# Altium footprint library Package_SO.PcbLib: 333 footprints (part 8 of 21)
Each footprint in its own frame and in the unit in brackets; x right, y up, seen from the top. Pads: shape width x height; smd on the part's side, far side on the other; paste and mask are expansions set on the pad; w line width, h text height; cw(c..) or ccw(c..) is an arc to the next point about the centre after c.
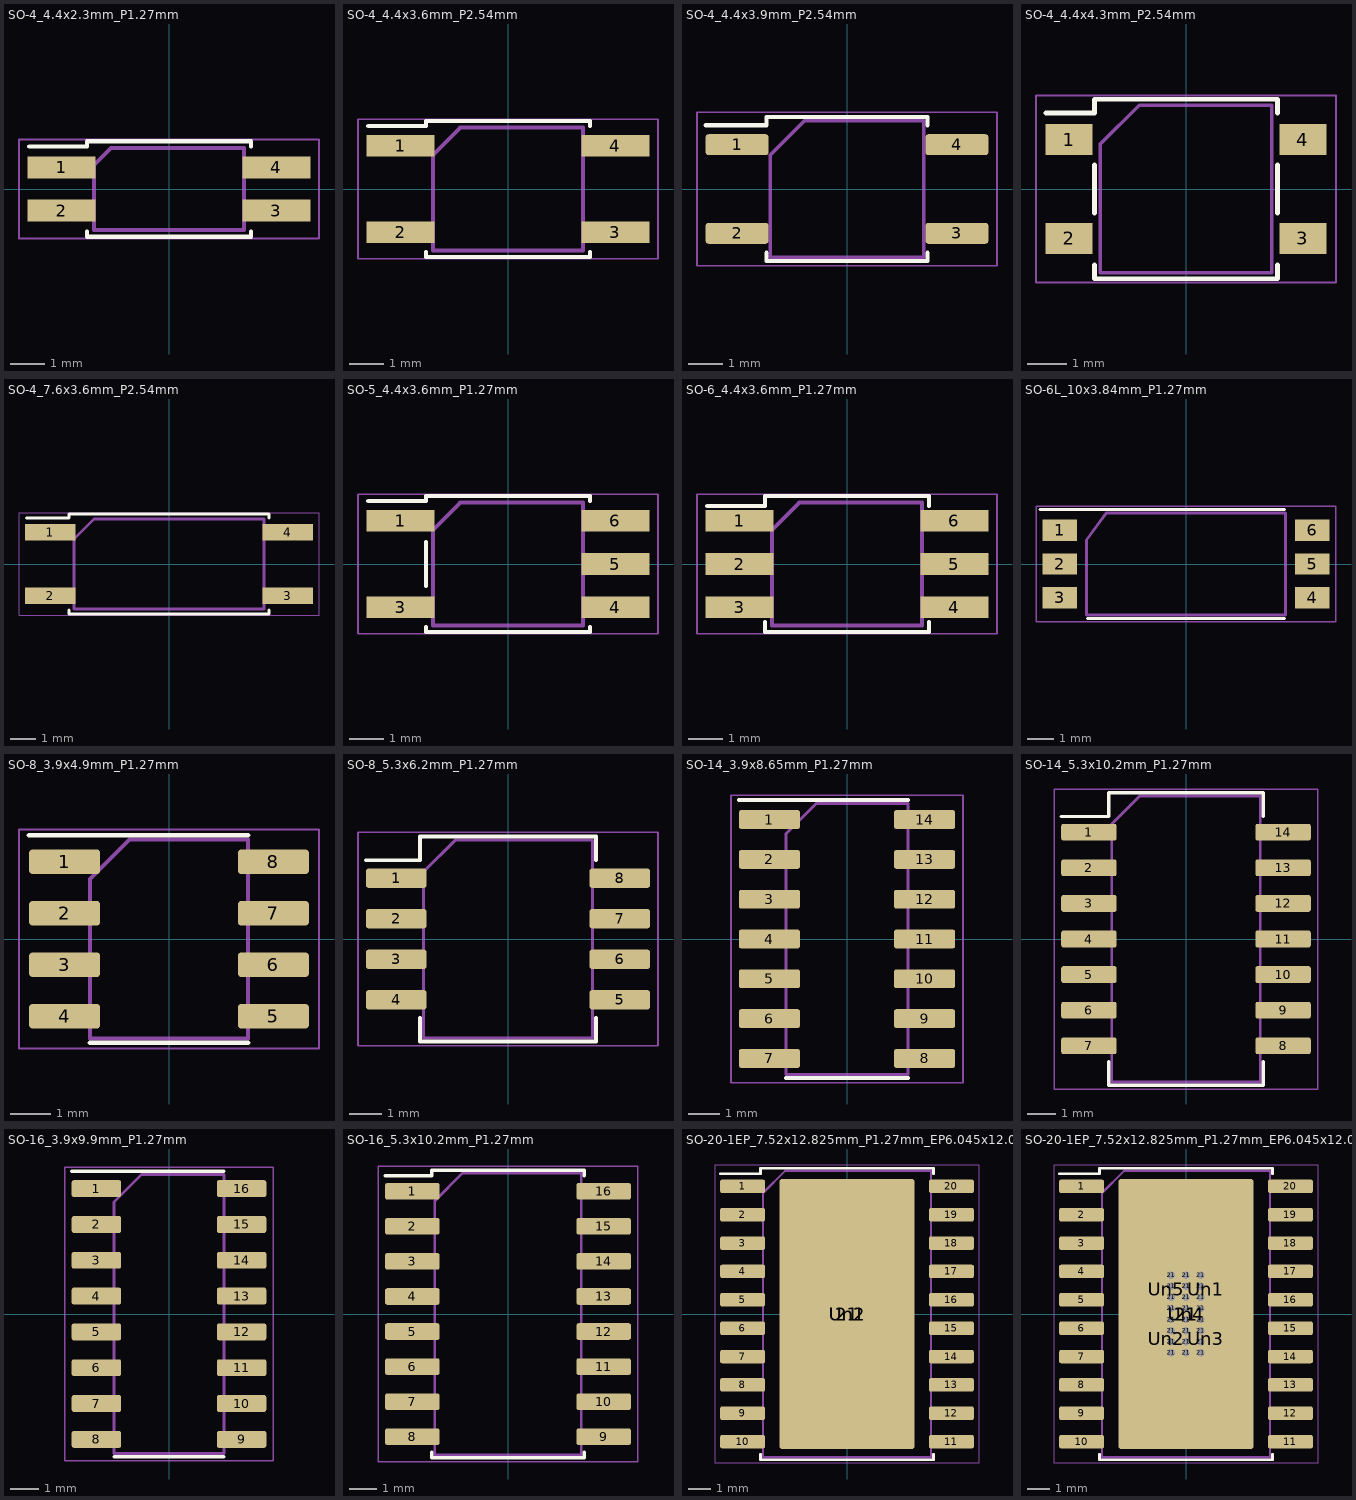
[diagram p7: the footprints below, top view; thin cyan lines are the x and y axes]

## SO-4_4.4x2.3mm_P1.27mm [mm]
pads (4):
  rect 2x0.64 smd: 1(-3.15,0.635) 2(-3.15,-0.635) 3(3.15,-0.635) 4(3.15,0.635)
F.SilkS:
  lines w0.12: -4.1,1.25 -2.4,1.25 -2.4,1.4 2.4,1.4 2.4,1.25 ; -2.4,-1.25 -2.4,-1.4 2.4,-1.4 2.4,-1.25
F.CrtYd:
  lines w0.05: -4.4,-1.45 -4.4,1.45 4.4,1.45 4.4,-1.45 -4.4,-1.45
F.Fab:
  lines w0.12: -2.2,-1.2 -2.2,0.7 -1.7,1.2 2.2,1.2 2.2,-1.2 -2.2,-1.2
  text "'.Designator'" at -3.897,-0.357 h1

## SO-4_4.4x3.6mm_P2.54mm [mm]
pads (4):
  rect 2x0.64 smd: 1(-3.15,1.27) 2(-3.15,-1.27) 3(3.15,-1.27) 4(3.15,1.27)
F.SilkS:
  lines w0.12: -4.1,1.85 -2.4,1.85 -2.4,2 2.4,2 2.4,1.85 ; -2.4,-1.85 -2.4,-2 2.4,-2 2.4,-1.85
F.CrtYd:
  lines w0.05: -4.4,-2.05 -4.4,2.05 4.4,2.05 4.4,-2.05 -4.4,-2.05
F.Fab:
  lines w0.12: -2.2,-1.8 -2.2,1 -1.4,1.8 2.2,1.8 2.2,-1.8 -2.2,-1.8
  text "'.Designator'" at -3.897,-0.357 h1

## SO-4_4.4x3.9mm_P2.54mm [mm]
pads (4):
  rrect25% 1.8x0.6 smd: 1(-3.15,1.27) 2(-3.15,-1.27) 3(3.15,-1.27) 4(3.15,1.27)
F.SilkS:
  lines w0.12: -4.05,1.83 -2.31,1.83 -2.31,2.06 0,2.06 2.31,2.06 2.31,1.83 ; -2.31,-1.83 -2.31,-2.06 0,-2.06 2.31,-2.06 2.31,-1.83
F.CrtYd:
  lines w0.05: -4.3,-2.2 -4.3,2.2 4.3,2.2 4.3,-2.2 -4.3,-2.2
F.Fab:
  lines w0.1: -2.2,-1.95 2.2,-1.95 2.2,1.95 -1.225,1.95 -2.2,0.975 -2.2,-1.95
  text "'.Designator'" at -3.897,-0.357 h1

## SO-4_4.4x4.3mm_P2.54mm [mm]
pads (4):
  rect 1.2x0.8 smd: 1(-3,1.27) 2(-3,-1.27) 3(3,-1.27) 4(3,1.27)
F.SilkS:
  lines w0.12: -3.6,1.95 -2.35,1.95 -2.35,2.3 2.35,2.3 2.35,1.95 ; -2.35,-1.95 -2.35,-2.3 2.35,-2.3 2.35,-1.95 ; -2.35,-0.62 -2.35,0.62 ; 2.35,-0.62 2.35,0.62
F.CrtYd:
  lines w0.05: -3.85,-2.4 -3.85,2.4 3.85,2.4 3.85,-2.4 -3.85,-2.4
F.Fab:
  lines w0.1: -2.2,-2.15 -2.2,1.15 -1.2,2.15 2.2,2.15 2.2,-2.15 -2.2,-2.15
  text "'.Designator'" at -3.897,-0.357 h1

## SO-4_7.6x3.6mm_P2.54mm [mm]
pads (4):
  rect 2x0.64 smd: 1(-4.75,1.27) 2(-4.75,-1.27) 3(4.75,-1.27) 4(4.75,1.27)
F.SilkS:
  lines w0.12: -5.7,1.85 -4,1.85 -4,2 4,2 4,1.85 ; -4,-1.85 -4,-2 4,-2 4,-1.85
F.CrtYd:
  lines w0.05: -6,-2.05 6,-2.05 6,2.05 -6,2.05 -6,-2.05
F.Fab:
  lines w0.12: -3.8,-1.8 -3.8,1 -3,1.8 3.8,1.8 3.8,-1.8 -3.8,-1.8
  text "'.Designator'" at -3.897,-0.357 h1

## SO-5_4.4x3.6mm_P1.27mm [mm]
pads (5):
  rect 2x0.64 smd: 1(-3.15,1.27) 3(-3.15,-1.27) 4(3.15,-1.27) 5(3.15,0) 6(3.15,1.27)
F.SilkS:
  lines w0.12: -4.1,1.85 -2.4,1.85 -2.4,2 2.4,2 2.4,1.85 ; -2.4,-1.85 -2.4,-2 2.4,-2 2.4,-1.85 ; -2.4,-0.65 -2.4,0.65
F.CrtYd:
  lines w0.05: -4.4,-2.05 4.4,-2.05 4.4,2.05 -4.4,2.05 -4.4,-2.05
F.Fab:
  lines w0.12: -2.2,-1.8 -2.2,1 -1.4,1.8 2.2,1.8 2.2,-1.8 -2.2,-1.8
  text "'.Designator'" at -3.897,-0.357 h1

## SO-6_4.4x3.6mm_P1.27mm [mm]
pads (6):
  rect 2x0.64 smd: 1(-3.15,1.27) 2(-3.15,0) 3(-3.15,-1.27) 4(3.15,-1.27) 5(3.15,0) 6(3.15,1.27)
F.SilkS:
  lines w0.12: -4.1,1.7 -2.4,1.7 -2.4,2 2.4,2 2.4,1.7 ; -2.4,-1.7 -2.4,-2 2.4,-2 2.4,-1.7
F.CrtYd:
  lines w0.05: -4.4,-2.05 4.4,-2.05 4.4,2.05 -4.4,2.05 -4.4,-2.05
F.Fab:
  lines w0.12: -2.2,-1.8 2.2,-1.8 2.2,1.8 -1.4,1.8 -2.2,1 -2.2,-1.8
  text "'.Designator'" at -3.897,-0.357 h1

## SO-6L_10x3.84mm_P1.27mm [mm]
pads (6):
  rect 1.3x0.8 smd: 1(-4.75,1.27) 2(-4.75,0) 3(-4.75,-1.27) 4(4.75,-1.27) 5(4.75,0) 6(4.75,1.27)
F.SilkS:
  lines w0.12: -5.5,2.05 3.7,2.05 ; -3.7,-2.05 3.7,-2.05
F.CrtYd:
  lines w0.05: -5.65,-2.17 -5.65,2.17 5.65,2.17 5.65,-2.17 -5.65,-2.17
F.Fab:
  lines w0.1: -3.75,-1.92 -3.75,0.9 -3,1.92 3.75,1.92 3.75,-1.92 -3.75,-1.92
  text "'.Designator'" at -1.698,-0.395 h0.5

## SO-8_3.9x4.9mm_P1.27mm [mm]
pads (8):
  rrect25% 1.75x0.6 smd: 1(-2.575,1.905) 2(-2.575,0.635) 3(-2.575,-0.635) 4(-2.575,-1.905) 5(2.575,-1.905) 6(2.575,-0.635) 7(2.575,0.635) 8(2.575,1.905)
F.SilkS:
  lines w0.12: -3.45,2.56 0,2.56 1.95,2.56 ; -1.95,-2.56 0,-2.56 1.95,-2.56
F.CrtYd:
  lines w0.05: -3.7,-2.7 3.7,-2.7 3.7,2.7 -3.7,2.7 -3.7,-2.7
F.Fab:
  lines w0.1: -1.95,-2.45 -1.95,1.475 -0.975,2.45 1.95,2.45 1.95,-2.45 -1.95,-2.45
  text "'.Designator'" at -3.969,-0.827 h0.98

## SO-8_5.3x6.2mm_P1.27mm [mm]
pads (8):
  rrect25% 1.9x0.6 smd: 1(-3.5,1.905) 2(-3.5,0.635) 3(-3.5,-0.635) 4(-3.5,-1.905) 5(3.5,-1.905) 6(3.5,-0.635) 7(3.5,0.635) 8(3.5,1.905)
F.SilkS:
  lines w0.12: -4.45,2.465 -2.76,2.465 -2.76,3.21 0,3.21 2.76,3.21 2.76,2.465 ; -2.76,-2.465 -2.76,-3.21 0,-3.21 2.76,-3.21 2.76,-2.465
F.CrtYd:
  lines w0.05: -4.7,-3.35 4.7,-3.35 4.7,3.35 -4.7,3.35 -4.7,-3.35
F.Fab:
  lines w0.1: -2.65,-3.1 2.65,-3.1 2.65,3.1 -1.65,3.1 -2.65,2.1 -2.65,-3.1
  text "'.Designator'" at -4.047,-0.84 h1

## SO-14_3.9x8.65mm_P1.27mm [mm]
pads (14):
  rrect25% 1.95x0.6 smd: 1(-2.475,3.81) 2(-2.475,2.54) 3(-2.475,1.27) 4(-2.475,0) 5(-2.475,-1.27) 6(-2.475,-2.54) 7(-2.475,-3.81) 8(2.475,-3.81) 9(2.475,-2.54) 10(2.475,-1.27) 11(2.475,0) 12(2.475,1.27) 13(2.475,2.54) 14(2.475,3.81)
F.SilkS:
  lines w0.12: -3.45,4.435 0,4.435 1.95,4.435 ; -1.95,-4.435 0,-4.435 1.95,-4.435
F.CrtYd:
  lines w0.05: -3.7,-4.58 -3.7,4.58 3.7,4.58 3.7,-4.58 -3.7,-4.58
F.Fab:
  lines w0.1: -1.95,-4.325 -1.95,3.35 -0.975,4.325 1.95,4.325 1.95,-4.325 -1.95,-4.325
  text "'.Designator'" at -3.969,-0.827 h0.98

## SO-14_5.3x10.2mm_P1.27mm [mm]
pads (14):
  rrect25% 1.975x0.6 smd: 1(-3.463,3.81) 2(-3.463,2.54) 3(-3.463,1.27) 4(-3.463,0) 5(-3.463,-1.27) 6(-3.463,-2.54) 7(-3.463,-3.81) 8(3.463,-3.81) 9(3.463,-2.54) 10(3.463,-1.27) 11(3.463,0) 12(3.463,1.27) 13(3.463,2.54) 14(3.463,3.81)
F.SilkS:
  lines w0.12: -4.45,4.37 -2.76,4.37 -2.76,5.21 0,5.21 2.76,5.21 2.76,4.37 ; -2.76,-4.37 -2.76,-5.21 0,-5.21 2.76,-5.21 2.76,-4.37
F.CrtYd:
  lines w0.05: -4.7,-5.35 -4.7,5.35 4.7,5.35 4.7,-5.35 -4.7,-5.35
F.Fab:
  lines w0.1: -2.65,-5.1 -2.65,4.1 -1.65,5.1 2.65,5.1 2.65,-5.1 -2.65,-5.1
  text "'.Designator'" at -4.047,-0.84 h1

## SO-16_3.9x9.9mm_P1.27mm [mm]
pads (16):
  rrect25% 1.75x0.6 smd: 1(-2.575,4.445) 2(-2.575,3.175) 3(-2.575,1.905) 4(-2.575,0.635) 5(-2.575,-0.635) 6(-2.575,-1.905) 7(-2.575,-3.175) 8(-2.575,-4.445) 9(2.575,-4.445) 10(2.575,-3.175) 11(2.575,-1.905) 12(2.575,-0.635) 13(2.575,0.635) 14(2.575,1.905) 15(2.575,3.175) 16(2.575,4.445)
F.SilkS:
  lines w0.12: -3.45,5.06 0,5.06 1.95,5.06 ; -1.95,-5.06 0,-5.06 1.95,-5.06
F.CrtYd:
  lines w0.05: -3.7,-5.2 -3.7,5.2 3.7,5.2 3.7,-5.2 -3.7,-5.2
F.Fab:
  lines w0.1: -1.95,-4.95 -1.95,3.975 -0.975,4.95 1.95,4.95 1.95,-4.95 -1.95,-4.95
  text "'.Designator'" at -3.969,-0.827 h0.98

## SO-16_5.3x10.2mm_P1.27mm [mm]
pads (16):
  rrect25% 1.975x0.6 smd: 1(-3.463,4.445) 2(-3.463,3.175) 3(-3.463,1.905) 4(-3.463,0.635) 5(-3.463,-0.635) 6(-3.463,-1.905) 7(-3.463,-3.175) 8(-3.463,-4.445) 9(3.463,-4.445) 10(3.463,-3.175) 11(3.463,-1.905) 12(3.463,-0.635) 13(3.463,0.635) 14(3.463,1.905) 15(3.463,3.175) 16(3.463,4.445)
F.SilkS:
  lines w0.12: -4.45,5.005 -2.76,5.005 -2.76,5.21 0,5.21 2.76,5.21 2.76,5.005 ; -2.76,-5.005 -2.76,-5.21 0,-5.21 2.76,-5.21 2.76,-5.005
F.CrtYd:
  lines w0.05: -4.7,-5.35 4.7,-5.35 4.7,5.35 -4.7,5.35 -4.7,-5.35
F.Fab:
  lines w0.1: -2.65,-5.1 2.65,-5.1 2.65,5.1 -1.65,5.1 -2.65,4.1 -2.65,-5.1
  text "'.Designator'" at -4.047,-0.84 h1

## SO-20-1EP_7.52x12.825mm_P1.27mm_EP6.045x12.09mm_Mask3.56x4.47mm [mm]
pads (23):
  rrect25% 2x0.6 smd: 1(-4.675,5.715) 2(-4.675,4.445) 3(-4.675,3.175) 4(-4.675,1.905) 5(-4.675,0.635) 6(-4.675,-0.635) 7(-4.675,-1.905) 8(-4.675,-3.175) 9(-4.675,-4.445) 10(-4.675,-5.715) 11(4.675,-5.715) 12(4.675,-4.445) 13(4.675,-3.175) 14(4.675,-1.905) 15(4.675,-0.635) 16(4.675,0.635) 17(4.675,1.905) 18(4.675,3.175) 19(4.675,4.445) 20(4.675,5.715)
  rrect4% 6.045x12.09 smd: 21(0,0)
  rrect9% 2.87x3.6 on Top Paste: Un1(0,0)
  rrect7% 3.56x4.47 on Top Solder: Un2(0,0)
F.SilkS:
  lines w0.12: -5.675,6.275 -3.87,6.275 -3.87,6.522 0,6.522 3.87,6.522 3.87,6.275 ; -3.87,-6.275 -3.87,-6.522 0,-6.522 3.87,-6.522 3.87,-6.275
F.CrtYd:
  lines w0.05: -5.93,-6.66 5.93,-6.66 5.93,6.66 -5.93,6.66 -5.93,-6.66
F.Fab:
  lines w0.1: -3.76,-6.412 -3.76,5.413 -2.76,6.412 3.76,6.412 3.76,-6.412 -3.76,-6.412
  text "'.Designator'" at -4.047,-0.84 h1

## SO-20-1EP_7.52x12.825mm_P1.27mm_EP6.045x12.09mm_Mask3.56x4.47mm_ThermalVias [mm]
pads (51):
  rrect25% 2x0.6 smd: 1(-4.675,5.715) 2(-4.675,4.445) 3(-4.675,3.175) 4(-4.675,1.905) 5(-4.675,0.635) 6(-4.675,-0.635) 7(-4.675,-1.905) 8(-4.675,-3.175) 9(-4.675,-4.445) 10(-4.675,-5.715) 11(4.675,-5.715) 12(4.675,-4.445) 13(4.675,-3.175) 14(4.675,-1.905) 15(4.675,-0.635) 16(4.675,0.635) 17(4.675,1.905) 18(4.675,3.175) 19(4.675,4.445) 20(4.675,5.715)
  round 0.49 hole 0.33: 21(-0.66,-1.733) 21(-0.66,-1.238) 21(-0.66,-0.743) 21(-0.66,-0.248) 21(-0.66,0.248) 21(-0.66,0.743) 21(-0.66,1.238) 21(-0.66,1.733) 21(0,-1.733) 21(0,-1.238) 21(0,-0.743) 21(0,-0.248) 21(0,0.248) 21(0,0.743) 21(0,1.238) 21(0,1.733) 21(0.66,-1.733) 21(0.66,-1.238) 21(0.66,-0.743) 21(0.66,-0.248) 21(0.66,0.248) 21(0.66,0.743) 21(0.66,1.238) 21(0.66,1.733)
  rrect4% 6.045x12.09 smd: 21(0,0)
  rrect14% 1.81x3.955 smd far side: 21(0,0)
  rrect16% 1.54x1.94 on Top Paste: Un1(0.89,1.115) Un2(-0.89,-1.115) Un3(0.89,-1.115) Un5(-0.89,1.115)
  rrect7% 3.56x4.47 on Top Solder: Un4(0,0)
F.SilkS:
  lines w0.12: -5.675,6.275 -3.87,6.275 -3.87,6.522 0,6.522 3.87,6.522 3.87,6.275 ; -3.87,-6.275 -3.87,-6.522 0,-6.522 3.87,-6.522 3.87,-6.275
F.CrtYd:
  lines w0.05: -5.93,-6.66 -5.93,6.66 5.93,6.66 5.93,-6.66 -5.93,-6.66
F.Fab:
  lines w0.1: -3.76,-6.412 -3.76,5.413 -2.76,6.412 3.76,6.412 3.76,-6.412 -3.76,-6.412
  text "'.Designator'" at -4.047,-0.84 h1